# Altium footprint library Inductors SMD.PcbLib: 145 footprints (part 10 of 10)
Each footprint in its own frame and in the unit in brackets; x right, y up, seen from the top. Pads: shape width x height; smd on the part's side, far side on the other; paste and mask are expansions set on the pad; w line width, h text height; cw(c..) or ccw(c..) is an arc to the next point about the centre after c.
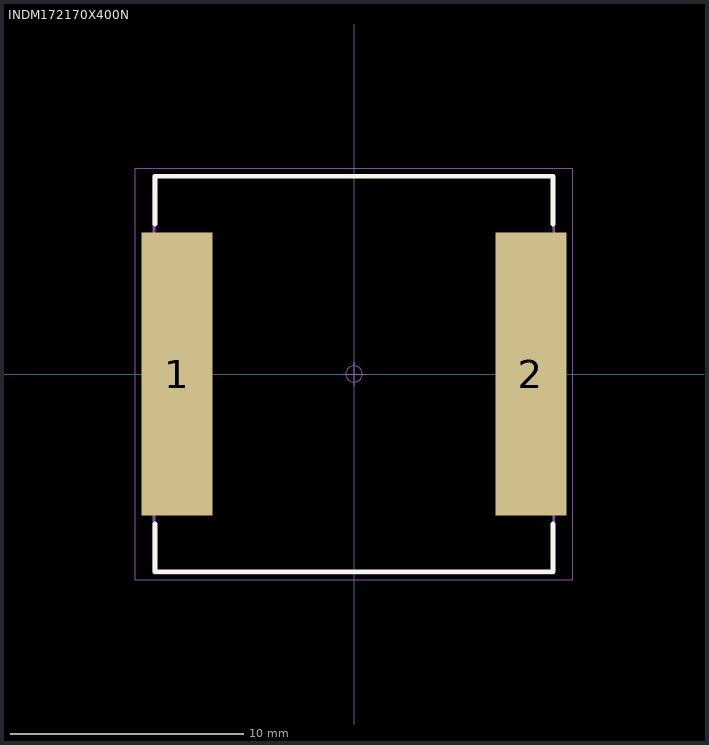
[diagram p9: the footprint, top view; thin cyan lines are the x and y axes]

## INDM172170X400N [mm] "Inductor, Molded Body; 17.15mm L X 17.023mm W X 4.00mm H"
height 4
pads (2):
  rect 3.05x12.15 smd: 1(-7.6,0) 2(7.6,0)
Top Overlay:
  lines w0.2: -8.55,-6.45 -8.55,-8.5 8.55,-8.5 8.55,-6.45 ; -8.55,6.45 -8.55,8.5 8.55,8.5 8.55,6.45
Mechanical 15:
  lines w0.1: -8.575,-8.512 -8.575,8.512 8.575,8.512 8.575,-8.512 -8.575,-8.512
Mechanical 20:
  circle w0.05: c0,0 r0.35
  lines w0.05: -0.5,0 0.5,0 ; 0,-0.5 0,0.5 ; -9.4,-8.85 -9.4,8.85 9.4,8.85 9.4,-8.85 -9.4,-8.85
Mechanical 21:
  lines w0.001: -8.638,-8.575 -8.638,8.575 8.638,8.575 8.638,-8.575 -8.638,-8.575
3D body "INDM172170X400N.stp": height 4, standoff 0, extent -8.575,-8.575 8.575,8.575